# Altium footprint library IC_updated.PcbLib: 64 footprints (part 4 of 4)
Each footprint in its own frame and in the unit in brackets; x right, y up, seen from the top. Pads: shape width x height; smd on the part's side, far side on the other; paste and mask are expansions set on the pad; w line width, h text height; cw(c..) or ccw(c..) is an arc to the next point about the centre after c.
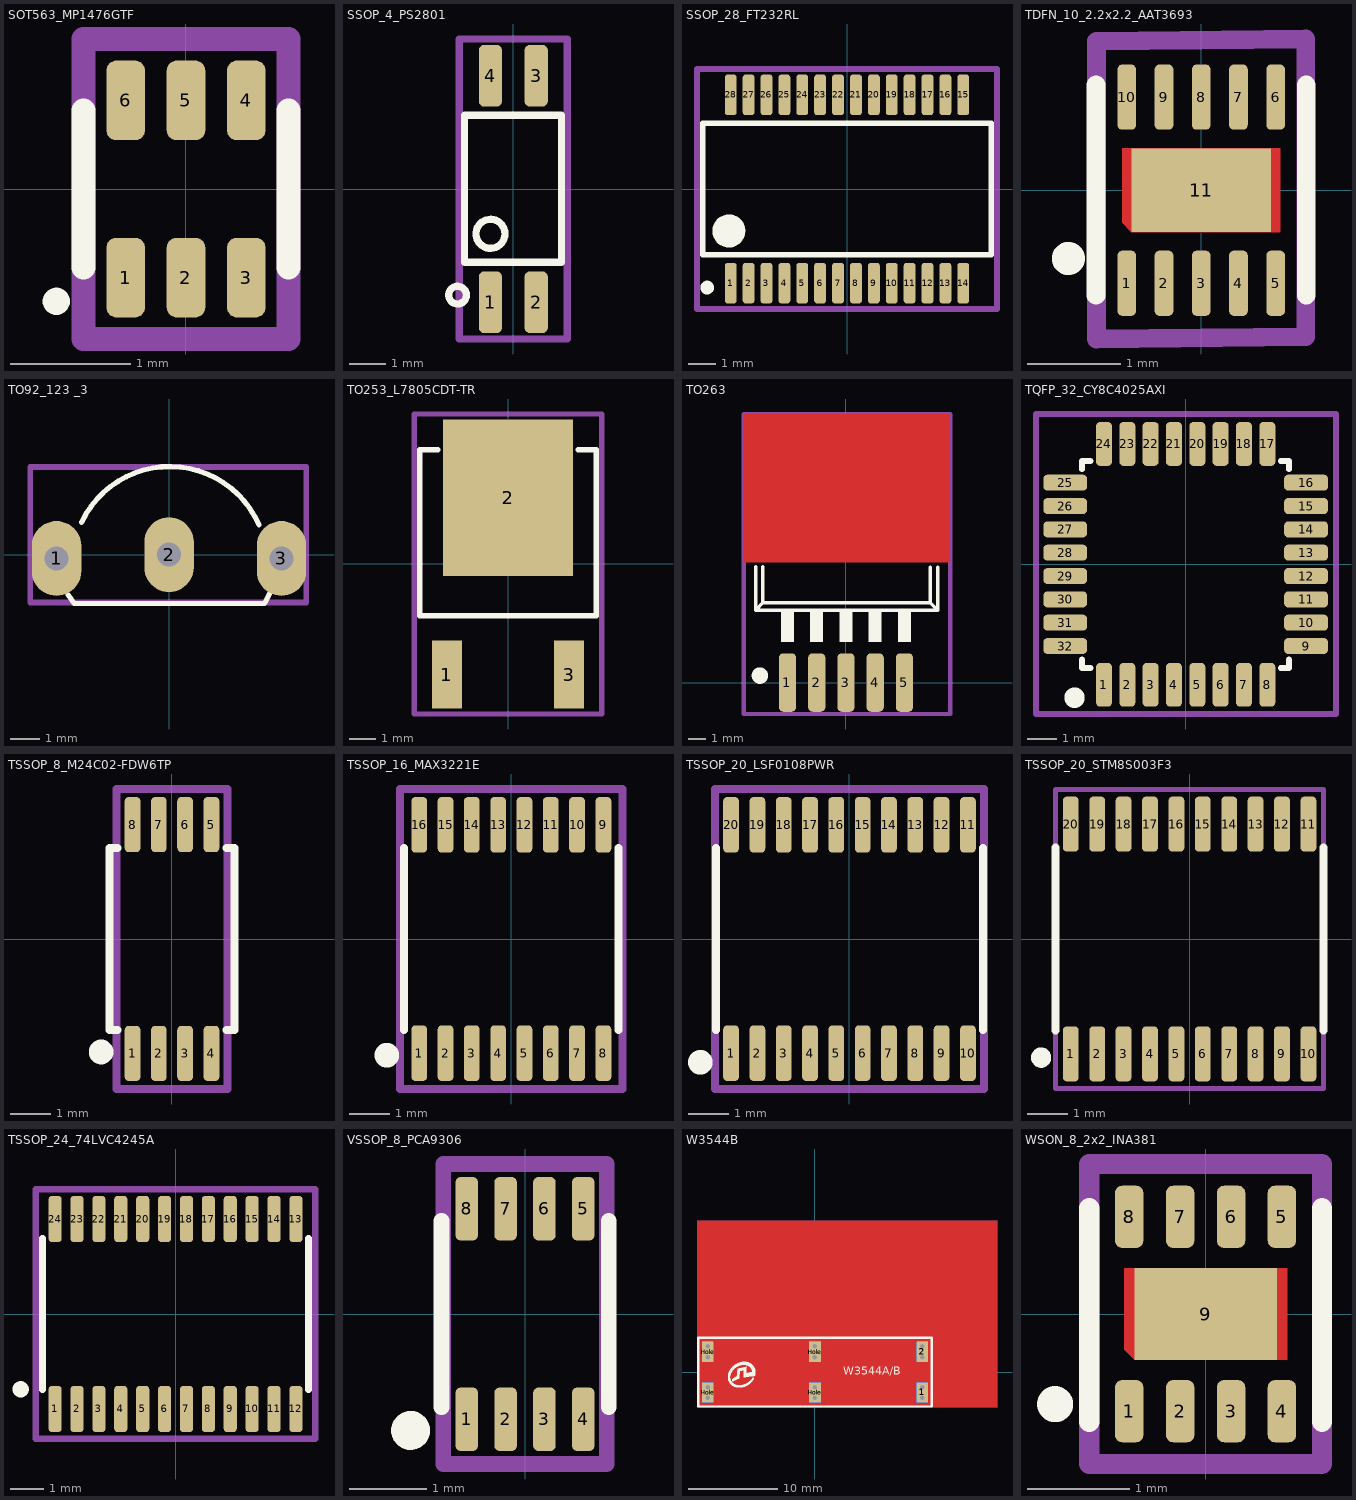
[diagram p3: the footprints below, top view; thin cyan lines are the x and y axes]

## SOT563_MP1476GTF [mm] "Integrated Circuit (IC), Small Outline Flat Lead (SOFL), 0.50 mm pitch; 6 pin, 1.60 mm L X 1.20 mm W X 0.60 mm H body"
height 0.6
pads (6):
  rrect50% 0.32x0.66 smd: 1(-0.5,-0.735) 2(0,-0.735) 3(0.5,-0.735) 4(0.5,0.735) 5(0,0.735) 6(-0.5,0.735)
Top Overlay:
  circle w0.114: c-1.076,-0.932 r0.056
  lines w0.2: -0.85,-0.65 -0.85,0.65 ; 0.85,-0.65 0.85,0.65
Mechanical 13:
  lines w0.2: -0.85,-1.245 -0.85,1.245 0.85,1.245 0.85,-1.245 -0.85,-1.245
  text ".Designator" at -0.66,-0.178 h1
3D body "ICSOFL6P50_160X160X60L30X22.STEP": height 0.6, standoff 0, extent -0.8,-0.8 0.8,0.8

## SSOP_4_PS2801 [mm] "Small Outline IC (SOIC), 1.27 mm pitch; 4 pin, 2.70 mm L X 4.40 mm W X 2.10 mm H body"
height 2.1
pads (4):
  rrect49% 0.65x1.72 smd: 1(-0.635,-3.145) 2(0.635,-3.145) 3(0.635,3.145) 4(-0.635,3.145)
Top Overlay:
  circle w0.2: c-1.549,-2.946 r0.246
  circle w0.2: c-0.635,-1.245 r0.403
  lines w0.2: -1.36,-2.032 1.34,-2.032 1.34,2.048 -1.36,2.048 -1.36,-2.032
Mechanical 13:
  lines w0.2: -1.5,-4.166 -1.5,4.166 1.5,4.166 1.5,-4.166 -1.5,-4.166
  text ".Designator" at 0.33,-3.505 h1.5
3D body "SOIC4P127_270X700X210L50X40.STEP": height 2.1, standoff 0, extent -1.35,-3.5 1.35,3.5

## SSOP_28_FT232RL [mm] "Small Outline Pkg (SOP), 0.65 mm pitch; 28 pin, 10.275 mm L X 5.30 mm W X 2.00 mm H body"
height 2
pads (28):
  rrect52% 0.432x1.48 smd: 1(-4.225,-3.42) 2(-3.575,-3.42) 3(-2.925,-3.42) 4(-2.275,-3.42) 5(-1.625,-3.42) 6(-0.975,-3.42) 7(-0.325,-3.42) 8(0.325,-3.42) 9(0.975,-3.42) 10(1.625,-3.42) 11(2.275,-3.42) 12(2.925,-3.42) 13(3.575,-3.42) 14(4.225,-3.42) 15(4.225,3.42) 16(3.575,3.42) 17(2.925,3.42) 18(2.275,3.42) 19(1.625,3.42) 20(0.975,3.42) 21(0.325,3.42) 22(-0.325,3.42) 23(-0.975,3.42) 24(-1.625,3.42) 25(-2.275,3.42) 26(-2.925,3.42) 27(-3.575,3.42) 28(-4.225,3.42)
Top Overlay:
  circle w0.6: c-4.293,-1.524 r0.3
  circle w0.25: c-5.08,-3.581 r0.125
  lines w0.2: -5.25,-2.388 5.25,-2.388 5.25,2.388 -5.25,2.388 -5.25,-2.388
Mechanical 13:
  lines w0.2: -5.45,-4.36 -5.45,-3 -5.45,3 -5.45,4.36 5.45,4.36 5.45,3 5.45,-3 5.45,-4.36 -5.45,-4.36
  text ".Designator" at -3.912,-0.279 h1.5
3D body "SOP28P65_1027X777X200L75X30.STEP": height 2, standoff 0, extent -5.138,-3.888 5.138,3.888

## TDFN_10_2.2x2.2_AAT3693 [mm] "Small Outline No-Lead (SON with Tab), 0.40 mm pitch; 10 pin, 2.20 mm L X 2.20 mm W X 0.80 mm H body"
height 0.8
pads (11):
  rrect50% 0.2x0.7 smd: 1(-0.8,-1) 2(-0.4,-1) 3(0,-1) 4(0.4,-1) 5(0.8,-1) 6(0.8,1) 7(0.4,1) 8(0,1) 9(-0.4,1) 10(-0.8,1)
  rect 1.5x0.9 smd paste-1.5 mask-1.5: 11(0,0)
Top Layer:
  region: 0.85,-0.45 -0.75,-0.45 -0.85,-0.35 -0.85,0.45 0.85,0.45
Top Overlay:
  circle w0.254: c-1.427,-0.734 r0.05
  lines w0.2: -1.13,-1.13 -1.13,1.13 ; 1.13,-1.13 1.13,1.13
Top Paste:
  region: 0.85,-0.45 -0.75,-0.45 -0.85,-0.35 -0.85,0.45 0.85,0.45
Top Solder:
  region: 0.85,-0.45 -0.75,-0.45 -0.85,-0.35 -0.85,0.45 0.85,0.45
Mechanical 13:
  lines w0.2: -1.125,-1.599 1.125,-1.575 1.125,1.625 -1.125,1.601 -1.125,-1.599
  text ".Designator" at -1,-0.225 h1
3D body "SON11P40_220X220X80L40X18T170X90.STEP": height 0.8, standoff 0, extent -1.1,-1.15 1.1,1.15

## TO92_123 _3 [mil] "TO-92"
height 200
pads (3):
  oval 66x100 hole 32: 1(-150,-5) 2(0,0) 3(150,-5)
Top Overlay:
  lines w7: -134.46,-53.63 -126.5,-65 127.5,-65 136,-48 ; -116.52,43.21 cw(c0.97,-12.43) 119.94,39.97
Mechanical 13:
  lines w7.87: -185,-64 -185,117 183,117 183,-64 -185,-64
  text ".Designator" at -87,5.43 h39.37
3D body "User Library-TO-92_SS254.step": height 394.65, standoff -97.48, extent -159.06,-58.47 159.05,93.89

## TO253_L7805CDT-TR [mm] "DPAK, 2.28 mm pitch; 3 pin, 6.10 mm L X 6.50 mm W X 2.40 mm H body"
height 2.4
pads (3):
  rect 1.12x2.55 smd: 1(-2.28,-4.13) 3(2.28,-4.13)
  rect 4.87x5.86 smd paste-5.86: 2(0,2.47)
Top Overlay:
  lines w0.2: -2.615,4.27 -3.3,4.27 -3.3,-1.93 3.3,-1.93 3.3,4.27 2.615,4.27
Top Paste:
  region: 2.01,-0.17 0.43,-0.17 0.43,1.21 2.01,1.21
  region: 2.01,1.78 0.43,1.78 0.43,3.16 2.01,3.16
  region: 2.01,3.73 0.43,3.73 0.43,5.11 2.01,5.11
  region: -0.43,-0.17 -2.01,-0.17 -2.01,1.21 -0.43,1.21
  region: -0.43,1.78 -2.01,1.78 -2.01,3.16 -0.43,3.16
  region: -0.43,3.73 -2.01,3.73 -2.01,5.11 -0.43,5.11
Mechanical 13:
  lines w0.2: -3.5,-5.605 -3.5,-2.13 -3.5,4.47 -3.5,5.6 3.5,5.6 3.5,4.47 3.5,-2.13 3.5,-5.605 -3.5,-5.605
  text ".Designator" at -0.279,3.353 h1.5
3D body "User Library-DPAK-1.step": height 2.44, standoff 0.03, extent -3.289,-5.045 3.251,4.893

## TO263 [mm]
pads (5):
  rrect50% 1x3.4 smd: 1(-3.4,0) 2(-1.7,0) 4(1.7,0) 5(3.4,0)
  rrect50% 1x3.4 smd mask+0: 3(0,0)
Top Layer:
  rectangle: -5.949,6.985 6.051,15.619
Top Overlay:
  circle w0.5: c-5.004,0.406 r0.23
  rectangle: 3.021,2.362 3.779,4.241
  rectangle: 1.321,2.362 2.079,4.241
  rectangle: -0.379,2.362 0.379,4.241
  rectangle: -2.079,2.362 -1.321,4.241
  rectangle: -3.779,2.362 -3.021,4.241
  lines w0.2: -5.254,6.731 -5.254,4.216 ; -4.831,6.731 -4.831,4.64 ; 4.906,6.706 4.906,4.64 ; 5.329,6.706 5.329,4.216 ; -5.254,4.216 -4.831,4.64 ; -5.254,4.216 5.329,4.216 ; -4.831,4.64 4.906,4.64 ; 4.906,4.64 5.329,4.216
Top Solder:
  rectangle: -5.517,7.366 5.609,14.529
  lines w0.254: -3.863,14.904 -5.344,14.481 ; 3.938,14.904 5.419,14.481 ; 5.588,14.351 5.715,14.224 5.715,7.239 5.08,7.239 -5.578,7.239 -5.583,7.244 -5.583,12.895 -5.583,14.165 ; 5.658,12.895 5.658,14.165 ; -5.583,14.165 cw(c-5.254,14.165) -5.345,14.481 ; -5.583,14.165 cw(c-5.254,14.165) -5.345,14.481 ; -3.773,14.917 ccw(c-3.773,14.588) -3.863,14.904 cw(c-3.773,14.588) -3.773,14.917 ; -3.773,14.917 3.847,14.917 ; 3.847,14.917 cw(c3.847,14.588) 3.938,14.904 ccw(c3.847,14.588) 3.847,14.917 ; 5.42,14.481 cw(c5.329,14.165) 5.658,14.165 ; 5.42,14.481 cw(c5.329,14.165) 5.658,14.165
  lines w0.508: -4.577,14.546 4.669,14.546
Mechanical 13:
  lines w0.254: -5.944,-1.829 6.071,-1.829 6.071,15.596 -5.944,15.596 -5.944,-1.829
  text ".Designator" at 0.508,-0.254 h3
3D body "SW3dPS-TO-263 5Ld.STEP": height 4.57, standoff -0.01, extent -5.11,-0.87 5.05,13.77

## TQFP_32_CY8C4025AXI [mm] "Quad Flat Pack (QFP), 0.80 mm pitch; square, 8 pin X 8 pin, 7.00 mm L X 7.00 mm W X 1.60 mm H body"
height 1.6
pads (32):
  rrect51% 0.55x1.5 smd: 1(-2.8,-4.13) 2(-2,-4.13) 3(-1.2,-4.13) 4(-0.4,-4.13) 5(0.4,-4.13) 6(1.2,-4.13) 7(2,-4.13) 8(2.8,-4.13) 17(2.8,4.13) 18(2,4.13) 19(1.2,4.13) 20(0.4,4.13) 21(-0.4,4.13) 22(-1.2,4.13) 23(-2,4.13) 24(-2.8,4.13)
  rrect51% 1.5x0.55 smd: 9(4.13,-2.8) 10(4.13,-2) 11(4.13,-1.2) 12(4.13,-0.4) 13(4.13,0.4) 14(4.13,1.2) 15(4.13,2) 16(4.13,2.8) 25(-4.13,2.8) 26(-4.13,2) 27(-4.13,1.2) 28(-4.13,0.4) 29(-4.13,-0.4) 30(-4.13,-1.2) 31(-4.13,-2) 32(-4.13,-2.8)
Top Overlay:
  circle w0.5: c-3.81,-4.572 r0.1
  lines w0.2: -3.55,-3.26 -3.55,-3.55 -3.26,-3.55 ; -3.55,3.26 -3.55,3.55 -3.26,3.55 ; 3.26,-3.55 3.55,-3.55 3.55,-3.26 ; 3.26,3.55 3.55,3.55 3.55,3.26
Mechanical 13:
  lines w0.2: -5.131,-5.131 -5.131,5.156 5.156,5.156 5.156,-5.131 -5.131,-5.131
  text ".Designator" at -3.15,-0.305 h1.5
3D body "QFP32P80_900X900X160L60X37.STEP": height 1.6, standoff 0, extent -4.5,-4.5 4.5,4.5

## TSSOP_8_M24C02-FDW6TP [mm] "Small Outline Pkg (SOP), 0.65 mm pitch; 8 pin, 3.00 mm L X 4.40 mm W X 1.20 mm H body"
height 1.2
pads (8):
  rrect51% 0.39x1.36 smd: 1(-0.975,-2.83) 2(-0.325,-2.83) 3(0.325,-2.83) 4(0.975,-2.83) 5(0.975,2.83) 6(0.325,2.83) 7(-0.325,2.83) 8(-0.975,2.83)
Top Overlay:
  circle w0.508: c-1.753,-2.794 r0.05
  lines w0.2: -1.35,-2.25 -1.55,-2.25 -1.55,2.25 -1.35,2.25 ; 1.35,-2.25 1.55,-2.25 1.55,2.25 1.35,2.25
Mechanical 13:
  lines w0.2: -1.37,-3.71 1.37,-3.71 1.37,-2.45 1.37,2.45 1.37,3.71 -1.37,3.71 -1.37,2.45 -1.37,-2.45 -1.37,-3.71
  text ".Designator" at -1.219,-0.203 h1.5
3D body "SOP8P65_300X640X120L60X24.STEP": height 1.2, standoff 0, extent -1.5,-3.2 1.5,3.2

## TSSOP_16_MAX3221E [mm] "Small Outline Pkg (SOP), 0.65 mm pitch; 16 pin, 5.00 mm L X 4.40 mm W X 1.20 mm H body"
height 1.2
pads (16):
  rrect51% 0.39x1.37 smd: 1(-2.275,-2.82) 2(-1.625,-2.82) 3(-0.975,-2.82) 4(-0.325,-2.82) 5(0.325,-2.82) 6(0.975,-2.82) 7(1.625,-2.82) 8(2.275,-2.82) 9(2.275,2.82) 10(1.625,2.82) 11(0.975,2.82) 12(0.325,2.82) 13(-0.325,2.82) 14(-0.975,2.82) 15(-1.625,2.82) 16(-2.275,2.82)
Top Overlay:
  circle w0.508: c-3.073,-2.87 r0.05
  lines w0.2: -2.65,-2.25 -2.65,2.25 ; 2.65,-2.25 2.65,2.25
Mechanical 13:
  lines w0.2: -2.75,-3.705 -2.75,-2.45 -2.75,2.45 -2.75,3.705 2.75,3.705 2.75,2.45 2.75,-2.45 2.75,-3.705 -2.75,-3.705
  text ".Designator" at -2.464,-0.229 h1.5
3D body "SOP16P65_500X640X120L62X24.STEP": height 1.2, standoff 0, extent -2.5,-3.2 2.5,3.2

## TSSOP_20_LSF0108PWR [mm] "Small Outline Pkg (SOP), 0.65 mm pitch; 20 pin, 6.50 mm L X 4.40 mm W X 1.20 mm H body"
height 1.2
pads (20):
  rrect51% 0.39x1.37 smd: 1(-2.925,-2.82) 2(-2.275,-2.82) 3(-1.625,-2.82) 4(-0.975,-2.82) 5(-0.325,-2.82) 6(0.325,-2.82) 7(0.975,-2.82) 8(1.625,-2.82) 9(2.275,-2.82) 10(2.925,-2.82) 11(2.925,2.82) 12(2.275,2.82) 13(1.625,2.82) 14(0.975,2.82) 15(0.325,2.82) 16(-0.325,2.82) 17(-0.975,2.82) 18(-1.625,2.82) 19(-2.275,2.82) 20(-2.925,2.82)
Top Overlay:
  circle w0.508: c-3.683,-3.048 r0.05
  lines w0.2: -3.3,-2.25 -3.3,2.25 ; 3.3,-2.25 3.3,2.25
Mechanical 13:
  lines w0.2: -3.32,-3.705 -3.32,-2.45 -3.32,2.45 -3.32,3.705 3.32,3.705 3.32,2.45 3.32,-2.45 3.32,-3.705 -3.32,-3.705
  text ".Designator" at -2.997,-0.102 h1.5
3D body "SOP20P65_650X640X120L62X24.STEP": height 1.2, standoff 0, extent -3.25,-3.2 3.25,3.2

## TSSOP_20_STM8S003F3 [mm] "Small Outline Pkg (SOP), 0.65 mm pitch; 20 pin, 6.50 mm L X 4.40 mm W X 1.20 mm H body"
height 1.2
pads (20):
  rrect51% 0.39x1.36 smd: 1(-2.925,-2.83) 2(-2.275,-2.83) 3(-1.625,-2.83) 4(-0.975,-2.83) 5(-0.325,-2.83) 6(0.325,-2.83) 7(0.975,-2.83) 8(1.625,-2.83) 9(2.275,-2.83) 10(2.925,-2.83) 11(2.925,2.83) 12(2.275,2.83) 13(1.625,2.83) 14(0.975,2.83) 15(0.325,2.83) 16(-0.325,2.83) 17(-0.975,2.83) 18(-1.625,2.83) 19(-2.275,2.83) 20(-2.925,2.83)
Top Overlay:
  circle w0.25: c-3.658,-2.921 r0.125
  lines w0.2: -3.3,-2.25 -3.3,2.25 ; 3.3,-2.25 3.3,2.25
Mechanical 13:
  lines w0.12: -3.3,-3.683 3.3,-3.683 3.3,3.683 -3.3,3.683 -3.3,-3.683
  text ".Designator" at -2.997,-0.254 h1.5
3D body "SOP20P65_650X640X120L60X24.STEP": height 1.2, standoff 0, extent -3.25,-3.2 3.25,3.2

## TSSOP_24_74LVC4245A [mm] "Small Outline Pkg (SOP), 0.65 mm pitch; 24 pin, 7.80 mm L X 4.40 mm W X 1.10 mm H body"
height 1.1
pads (24):
  rrect51% 0.39x1.37 smd: 1(-3.575,-2.82) 2(-2.925,-2.82) 3(-2.275,-2.82) 4(-1.625,-2.82) 5(-0.975,-2.82) 6(-0.325,-2.82) 7(0.325,-2.82) 8(0.975,-2.82) 9(1.625,-2.82) 10(2.275,-2.82) 11(2.925,-2.82) 12(3.575,-2.82) 13(3.575,2.82) 14(2.925,2.82) 15(2.275,2.82) 16(1.625,2.82) 17(0.975,2.82) 18(0.325,2.82) 19(-0.325,2.82) 20(-0.975,2.82) 21(-1.625,2.82) 22(-2.275,2.82) 23(-2.925,2.82) 24(-3.575,2.82)
Top Overlay:
  circle w0.381: c-4.597,-2.235 r0.05
  lines w0.2: -3.95,-2.25 -3.95,2.25 ; 3.95,-2.25 3.95,2.25
Mechanical 13:
  lines w0.2: -4.15,-3.705 -4.15,-2.45 -4.15,2.45 -4.15,3.705 4.15,3.705 4.15,2.45 4.15,-2.45 4.15,-3.705 -4.15,-3.705
  text ".Designator" at -3.81,-0.279 h1.5
3D body "SOP24P65_780X640X110L62X24.STEP": height 1.1, standoff 0, extent -3.9,-3.2 3.9,3.2

## VSSOP_8_PCA9306 [mm] "Small Outline Pkg (SOP), 0.50 mm pitch; 8 pin, 2.00 mm L X 2.30 mm W X 0.90 mm H body"
height 0.9
pads (8):
  rrect48% 0.29x0.82 smd: 1(-0.75,-1.355) 2(-0.25,-1.355) 3(0.25,-1.355) 4(0.75,-1.355) 5(0.75,1.355) 6(0.25,1.355) 7(-0.25,1.355) 8(-0.75,1.355)
Top Overlay:
  circle w0.25: c-1.473,-1.499 r0.125
  lines w0.2: -1.075,-1.2 -1.075,1.2 ; 1.075,-1.2 1.075,1.2
Mechanical 13:
  lines w0.2: -1.05,-1.93 1.05,-1.93 1.05,1.93 -1.05,1.93 -1.05,-1.93
  text ".Designator" at -0.94,-0.305 h1
3D body "SOP8P50_200X310X90L27X21.STEP": height 0.9, standoff 0, extent -1,-1.55 1,1.55

## W3544B [mm]
pads (12):
  rect 1.3x2.25 smd far side: 1(11.95,-2.27) 2(11.95,2.27) Hole(-11.95,-2.27) Hole(-11.95,2.27) Hole(0,-2.27) Hole(0,2.27)
  rect 1.3x2.25 smd: 1(11.95,-2.27) 2(11.95,2.27) Hole(-11.95,-2.27) Hole(-11.95,2.27) Hole(0,-2.27) Hole(0,2.27)
via 11.95,1.67 diameter 0.8 hole 0.5
via 11.95,2.87 diameter 0.8 hole 0.5
via 0,1.67 diameter 0.8 hole 0.5
via 0,2.87 diameter 0.8 hole 0.5
via -11.95,1.67 diameter 0.8 hole 0.5
via -11.95,2.87 diameter 0.8 hole 0.5
via 11.95,-2.87 diameter 0.8 hole 0.5
via 11.95,-1.67 diameter 0.8 hole 0.5
via 0,-2.87 diameter 0.8 hole 0.5
via 0,-1.67 diameter 0.8 hole 0.5
via -11.95,-1.67 diameter 0.8 hole 0.5
via -11.95,-2.87 diameter 0.8 hole 0.5
Top Layer:
  pour cut-out: -13.15,-3.895 -13.15,16.855 20.3,16.855 20.3,-3.895
Bottom Layer:
  pour cut-out: -13.15,-3.895 -13.15,16.855 20.3,16.855 20.3,-3.895
Top Overlay:
  drawing of 557 lines, arcs and shapes, not listed
  text "W3544A/B" at 3.175,-0.61 h1.52
Mechanical 15:
  lines w0.1: -0.508,-0.004 0.492,-0.004 ; -0.008,-0.504 -0.008,0.496
Mechanical 16:
  lines w0.1: 13.577,-1.305 14.847,-1.305 ; 13.577,-1.305 13.577,1.286 14.847,1.286 14.847,-1.305 ; 13.577,-1.305 13.577,1.286 14.847,1.286 14.847,-1.305 ; 13.577,-1.305 14.847,-1.305
3D body: height 3, standoff 0, extent 10.624,-3.169 11.222,-2.571
3D body: height 3, standoff 0, extent 10.624,-1.95 11.222,-1.352
3D body: height 3, standoff 0, extent -13.03,-3.835 13.03,3.81
3D body: height 3, standoff 0, extent 10.624,2.571 11.222,3.17
3D body: height 3, standoff 0, extent 9.913,2.571 10.511,3.17

## WSON_8_2x2_INA381 [mm] "Small Outline No-Lead (SON with Tab), 0.50 mm pitch; 8 pin, 2.00 mm L X 2.00 mm W X 0.80 mm H body"
height 0.8
pads (9):
  rrect50% 0.28x0.61 smd: 1(-0.75,-0.955) 2(-0.25,-0.955) 3(0.25,-0.955) 4(0.75,-0.955) 5(0.75,0.955) 6(0.25,0.955) 7(-0.25,0.955) 8(-0.75,0.955)
  rect 1.4x0.9 smd paste-1.4 mask-1.4: 9(0,0)
Top Layer:
  region: 0.8,-0.45 -0.7,-0.45 -0.8,-0.35 -0.8,0.45 0.8,0.45
Top Overlay:
  circle w0.254: c-1.478,-0.886 r0.05
  lines w0.2: -1.143,-1.059 -1.143,1.041 ; 1.143,-1.059 1.143,1.041
Top Paste:
  region: 0.8,-0.45 -0.7,-0.45 -0.8,-0.35 -0.8,0.45 0.8,0.45
Top Solder:
  region: 0.8,-0.45 -0.7,-0.45 -0.8,-0.35 -0.8,0.45 0.8,0.45
Mechanical 13:
  lines w0.2: -1.143,-1.473 1.143,-1.473 1.143,1.473 -1.143,1.473 -1.143,-1.473
  text ".Designator" at -0.965,-0.152 h1
3D body "SON9P50_200X200X80L30X25T160X90.STEP": height 0.8, standoff 0, extent -1,-1.05 1,1.05